# Altium schematic symbol library BARKO_SCHLIB.SchLib: 1064 symbols (part 7 of 11) (continued)
## IC-TIOL111DMWR (continued)
IC TRANSCEIVER 1/1 10VSON; Manufacturer: Texas Instruments; Manufacturer Part Number: TIOL111DMWR; Receiver Hysteresis: 750mV; Data Rate: 250Kbps; Supplier 1: Digi-Key; Supplier Part Number 1: 296-49943-1-ND; Stock: 596; Pricing: 1=3.47, 10=3.12, 25=2.9496, 100=2.4254, 250=2.1763, 500=2.0976 (USD); RoHS: No; Mount: Surface Mount; Min Operating Temperature: -40°C; Max Operating Temperature: 125°C; Packaging: Cut Tape; ComponentLink1URL: http://www.ti.com/lit/ds/symlink/tiol111.pdf?src-supplier=Digi-Key; ComponentLink1Description: http://www.ti.com/lit/ds/symlink/tiol111.pdf?src-supplier=Digi-Key
footprint 10-VSON EP (SON, 10-Leads, Body 3x3mm, Pitch 0.5mm, Thermal Pad 2.4x1.65mm, TI Recommended)
pins: 1 VCC_IN/OUT , 2 NFAULT, 3 RX, 4 TX, 5 EN, 6 ILIM, 7 L-, 8 CQ, 9 L+, 10 WAKE, 11 GND

## IC-TJA1051T,118
designator U?, comment TJA1051T,118
IC CAN TXRX HI-SPEED 8-SOIC; Manufacturer: NXP Semiconductors; Data Rate: 1Mbps; Min Supply Voltage: 4.5V; Max Supply Voltage: 5.5V; Number of Transceivers: 1; Nominal Supply Current: 70mA; Operating Supply Voltage: 5V; Washability: OK; .Creator: M.OZKAN; .PCBCHK: USED; Supplier 1: Digi-Key; Manufacturer Part Number: TJA1051T,118; Stock 1: 59856; Pricing 1: 1=1.12000, 10=1.00000, 100=0.77990, 500=0.64426, 1000=0.50862 (USD); RoHS: Yes; Mount: Surface Mount; Case/Package: SO; Number of Pins: 8; Min Operating Temperature: -40°C; Max Operating Temperature: 125°C; Package Quantity: 1; Packaging: Tape and Reel; Max Supply Current: 70mA; Interface: CAN; Radiation Hardening: No; Lead Free: Lead Free; ComponentLink1URL: https://datasheet.ciiva.com/1767/tja1051-1767286.pdf?src-supplier=Digi-Key; ComponentLink1Description: https://datasheet.ciiva.com/1767/tja1051-1767286.pdf?src-supplier=Digi-Key; ComponentLink2URL: https://datasheet.ciiva.com/16199/tja1051-16199462.pdf?src-supplier=Future+Electronics; ComponentLink2Description: https://datasheet.ciiva.com/16199/tja1051-16199462.pdf?src-supplier=Future+Electronics; ComponentLink3URL: https://datasheet.ciiva.com/1767/tja1051-1767287.pdf?src-supplier=Digi-Key; ComponentLink3Description: https://datasheet.ciiva.com/1767/tja1051-1767287.pdf?src-supplier=Digi-Key; ComponentLink4URL: https://datasheet.ciiva.com/11212/tja1051-11212759.pdf?src-supplier=Avnet; ComponentLink4Description: https://datasheet.ciiva.com/11212/tja1051-11212759.pdf?src-supplier=Avnet; ComponentLink5URL: https://datasheet.ciiva.com/1767/tja1051-1767288.pdf?src-supplier=Digi-Key; ComponentLink5Description: https://datasheet.ciiva.com/1767/tja1051-1767288.pdf?src-supplier=Digi-Key; ComponentLink6URL: https://datasheet.ciiva.com/15149/getdatasheetpartid-248780-15149981.pdf?src-supplier=Verical; ComponentLink6Description: https://datasheet.ciiva.com/15149/getdatasheetpartid-248780-15149981.pdf?src-supplier=Verical; Supplier Part Number 1: 568-8683-1-ND; .SCHCHK: USED
footprint SOIC8
pins: 1 TX (in), 2 GND (power), 3 VCC (power), 4 RX (out), 5 NC (in), 6 CANL (io), 7 CANH (io), 8 S (in)

## IC-TJA1051T/3/1J
designator U?, comment TJA1051T/3
IC CAN TRANSEIVER HS 8SOIC; Manufacturer: NXP Semiconductors; Manufacturer Part Number: TJA1051T/3/1J; Data Rate: 5Mbps; Min Supply Voltage: 4.5V; Max Supply Voltage: 5.5V; Number of Transceivers: 1; Simplex/Duplex: Half Duplex; Receiver Hysteresis: 120mV; Max Supply Current: 70mA; Washability: OK; .Creator: M.OZKAN; .PCBCHK: USED; Supplier 1: Digi-Key; Stock 1: 2965; Pricing 1: 1=1.07000, 10=0.95300, 100=0.74270, 500=0.61352, 1000=0.48437 (USD); RoHS: Yes; Mount: Surface Mount; Case/Package: SOIC; Number of Pins: 8; Contact Plating: Gold,Silver; Min Operating Temperature: -40°C; Max Operating Temperature: 150°C; Packaging: Tape and Reel; REACH SVHC: No SVHC; Lead Free: Lead Free; ComponentLink1URL: http://www.farnell.com/datasheets/1931504.pdf?src-supplier=Farnell; ComponentLink1Description: http://www.farnell.com/datasheets/1931504.pdf?src-supplier=Farnell; ComponentLink2URL: http://www.nxp.com/documents/data_sheet/TJA1051.pdf?src-supplier=Avnet; ComponentLink2Description: http://www.nxp.com/documents/data_sheet/TJA1051.pdf?src-supplier=Avnet; ComponentLink3URL: http://www.nxp.com/documents/data_sheet/TJA1051.pdf?src-supplier=Avnet+Asia; ComponentLink3Description: http://www.nxp.com/documents/data_sheet/TJA1051.pdf?src-supplier=Avnet+Asia; ComponentLink4URL: https://www.nxp.com/docs/en/data-sheet/TJA1051.pdf?src-supplier=Digi-Key; ComponentLink4Description: https://www.nxp.com/docs/en/data-sheet/TJA1051.pdf?src-supplier=Digi-Key; ComponentLink5URL: http://www.farnell.com/datasheets/1931504.pdf?src-supplier=Element14; ComponentLink5Description: http://www.farnell.com/datasheets/1931504.pdf?src-supplier=Element14; Supplier Part Number 1: 568-13277-1-ND; .SCHCHK: USED
footprint SOIC8
pins: 1 TX (in), 2 GND (power), 3 VCC (power), 4 RX (out), 5 VIO (in), 6 CANL (io), 7 CANH (io), 8 S (in)

## IC-TJA1051T/E,118
designator U?, comment TJA1051T/E,118
IC TRANSCEIVER HALF 1/1 8SO; Manufacturer: NXP Semiconductors; Data Rate: 1Mbps; Max Supply Voltage: 5.5V; Operating Supply Voltage: 5V; Min Supply Voltage: 4.5V; Nominal Supply Current: 70mA; Number of Transceivers: 1; Washability: OK; .Creator: M.OZKAN; .PCBCHK: USED; ComponentLink1URL: https://datasheet.ciiva.com/16639/tja1051-16639386.pdf?src-supplier=Avnet+Europe; ComponentLink1Description: https://datasheet.ciiva.com/16639/tja1051-16639386.pdf?src-supplier=Avnet+Europe; ComponentLink2URL: https://datasheet.ciiva.com/11212/tja1051-11212764.pdf?src-supplier=Avnet; ComponentLink2Description: https://datasheet.ciiva.com/11212/tja1051-11212764.pdf?src-supplier=Avnet; ComponentLink3URL: https://datasheet.ciiva.com/1767/tja1051-1767286.pdf?src-supplier=Digi-Key; ComponentLink3Description: https://datasheet.ciiva.com/1767/tja1051-1767286.pdf?src-supplier=Digi-Key; ComponentLink4URL: https://datasheet.ciiva.com/16199/tja1051-16199462.pdf?src-supplier=Future+Electronics; ComponentLink4Description: https://datasheet.ciiva.com/16199/tja1051-16199462.pdf?src-supplier=Future+Electronics; ComponentLink5URL: https://datasheet.ciiva.com/1767/tja1051-1767287.pdf?src-supplier=Digi-Key; ComponentLink5Description: https://datasheet.ciiva.com/1767/tja1051-1767287.pdf?src-supplier=Digi-Key; ComponentLink6URL: https://datasheet.ciiva.com/11212/tja1051-11212759.pdf?src-supplier=Avnet; ComponentLink6Description: https://datasheet.ciiva.com/11212/tja1051-11212759.pdf?src-supplier=Avnet; ComponentLink7URL: https://datasheet.ciiva.com/1767/tja1051-1767288.pdf?src-supplier=Digi-Key; ComponentLink7Description: https://datasheet.ciiva.com/1767/tja1051-1767288.pdf?src-supplier=Digi-Key; ComponentLink8URL: https://datasheet.ciiva.com/15149/getdatasheetpartid-248780-15149981.pdf?src-supplier=Verical; ComponentLink8Description: https://datasheet.ciiva.com/15149/getdatasheetpartid-248780-15149981.pdf?src-supplier=Verical; Supplier 1: Digi-Key; Manufacturer Part Number: TJA1051T/E,118; Stock 1: 48191; Pricing 1: 1=1.07000, 10=0.95300, 100=0.74270, 500=0.61352, 1000=0.48437 (USD); RoHS: Yes; Mount: Surface Mount; Case/Package: SO; Number of Pins: 8; Min Operating Temperature: -40°C; Max Operating Temperature: 150°C; Packaging: Tape and Reel; Package Quantity: 2500; Radiation Hardening: No; Lead Free: Lead Free; Supplier Part Number 1: 568-8685-1-ND; .SCHCHK: USED
footprint SOIC8
pins: 1 TX (in), 2 GND (power), 3 VCC (power), 4 RX (out), 5 EN (in), 6 CANL (io), 7 CANH (io), 8 S (in)

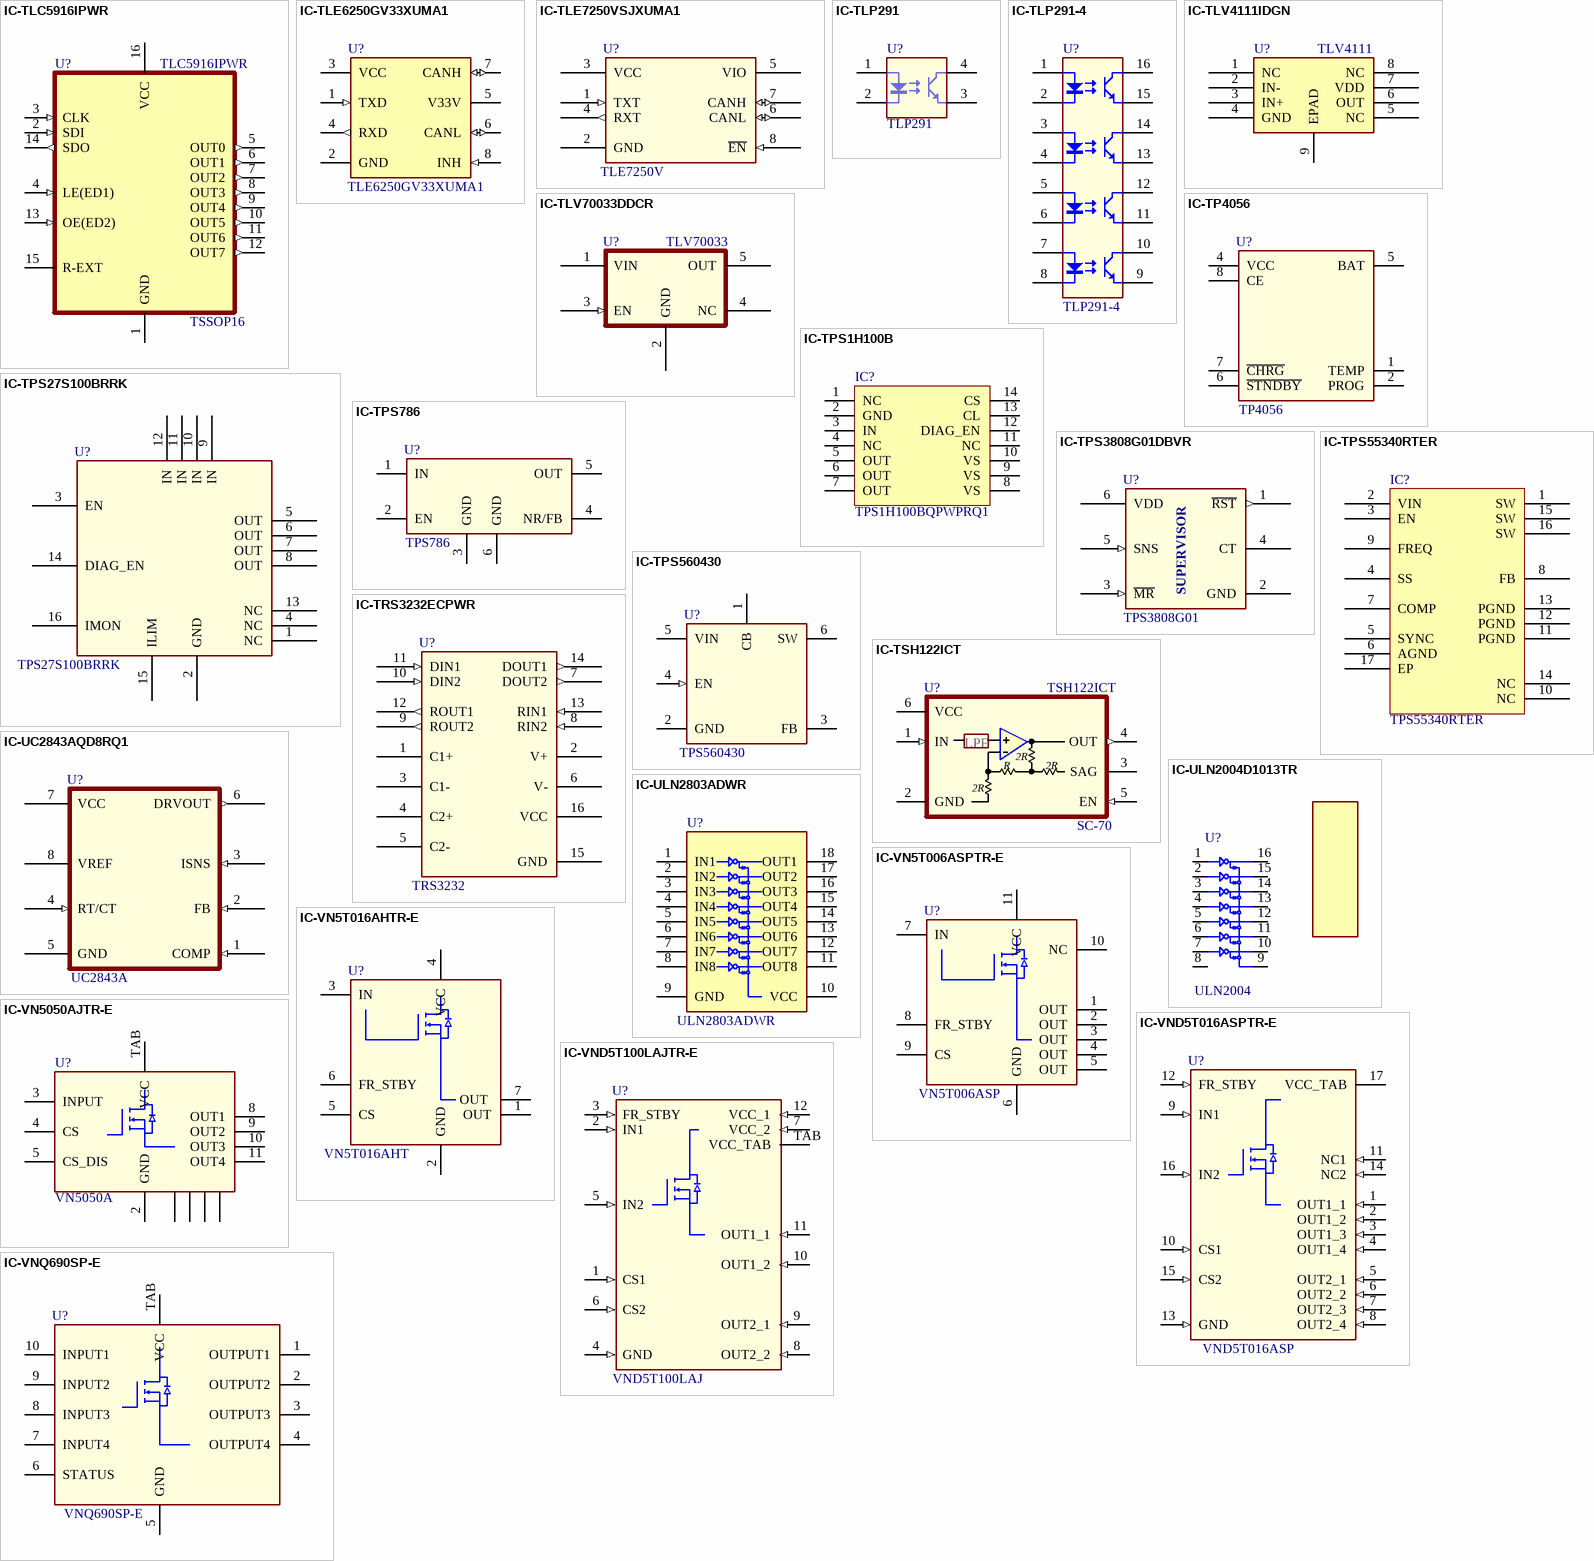
[diagram p30: symbols IC-TLC5916IPWR to IC-VNQ690SP-E]

## IC-TLC5916IPWR
designator U?, comment TLC5916IPWR  Case/Package: TSSOP16
IC LED DRIVER LINEAR 16-TSSOP; Manufacturer: Texas Instruments; Max Power Dissipation: 900mW; Number of Outputs: 8; Frequency: 30MHz; Max Supply Voltage: 5.5V; Min Supply Voltage: 3V; Nominal Supply Current: 22mA; Output Current: 120mA; Output Voltage: 17V; Low Level Output Current: 1mA; High Level Output Current: -1mA; Topology: Boost; .Creator: F:TALI; .PCBCHK: USED; Washability: OK; Supplier 1: Digi-Key; Manufacturer Part Number: TLC5916IPWR; Stock 1: 35679; Pricing 1: 1=1.41, 10=1.258, 100=0.9808, 500=0.8102, 1000=0.63963 (USD); Number of Pins: 16; Weight: 0.002183oz; Contact Plating: Gold; Min Operating Temperature: -40°C; Max Operating Temperature: 125°C; Package Quantity: 1; Packaging: Tape and Reel; Max Output Current: 120mA; Max Input Voltage: 5.5V; Min Input Voltage: 3V; Max Supply Current: 22mA; Power Dissipation: 900mW; Number of Segments: 8; Switching Frequency: 30MHz; Radiation Hardening: No; Lead Free: Lead Free; REACH SVHC: No SVHC; ComponentLink1URL: http://www.farnell.com/datasheets/1887543.pdf; ComponentLink1Description: http://www.farnell.com/datasheets/1887543.pdf; ComponentLink2URL: http://www.ti.com/lit/ds/symlink/tlc5917.pdf; ComponentLink2Description: http://www.ti.com/lit/ds/symlink/tlc5917.pdf; ComponentLink3URL: https://www.verical.com/server-webapp/html/getDatasheet?partID=297377; ComponentLink3Description: https://www.verical.com/server-webapp/html/getDatasheet?partID=297377; ComponentLink4URL: http://datasheet.iiic.cc/texas_instruments/TLC5916IPWR.pdf; ComponentLink4Description: http://datasheet.iiic.cc/texas_instruments/TLC5916IPWR.pdf; Supplier Part Number 1: 296-22711-6-ND; .SCHCHK: USED
footprint TSSOP16
pins: 1 GND (power), 2 SDI (in), 3 CLK (in), 4 LE(ED1) (in), 5 OUT0 (out), 6 OUT1 (out), 7 OUT2 (out), 8 OUT3 (out), 9 OUT4 (out), 10 OUT5 (out), 11 OUT6 (out), 12 OUT7 (out), 13 OE(ED2) (in), 14 SDO (out), 15 R-EXT, 16 VCC (power)

## IC-TLE6250GV33XUMA1
designator U?, comment TLE6250GV33XUMA1
CAN 1MBd Standby 5V Automotive 8-Pin DSO T/R; Manufacturer: Infineon; Min Supply Voltage: 4.5V; Max Supply Voltage: 5.5V; Number of Transceivers: 1; Nominal Supply Current: 70mA; Quiescent Current: 10A; Washability: OK; .Creator: M.OZKAN; .PCBCHK: USED; Supplier 1: Digi-Key; Manufacturer Part Number: TLE6250GV33XUMA1; Stock 1: 11250; Pricing 1: 1=1.63000, 10=1.45700, 100=1.13620, 500=0.93860, 1000=0.74100 (USD); RoHS: Yes; Mount: Surface Mount; Case/Package: SOIC; Number of Pins: 8; Min Operating Temperature: -40°C; Max Operating Temperature: 150°C; Operating Supply Voltage: 5V; Packaging: Tape and Reel; Lead Free: Lead Free; Halogen Free: Halogen Free; ComponentLink1URL: https://datasheet.ciiva.com/25624/0900766b81074499-25624341.pdf?src-supplier=RSComponents; ComponentLink1Description: https://datasheet.ciiva.com/25624/0900766b81074499-25624341.pdf?src-supplier=RSComponents; Supplier Part Number 1: TLE6250GV33XUMA1CT-ND; .SCHCHK: USED
footprint INF-PG-DSO-8-16_M (SOP, 8-Leads, Body 4.9x3.9mm, Pitch 1.27mm, IPC Low Density)
pins: 1 TXD (in) "CAN transmit data input; 20 k ohm pull-up, LOW in dominant state", 2 GND (power) "Ground", 3 VCC (power) "5 V Supply input", 4 RXD (out) "CAN receive data output; LOW in dominant state, integrated pull-up", 5 V33V (power) "Logic supply input;3.3 V OR 5 V microcontroller logic supply can be connected here! The digital I/Os of the TLE6250GV33 adopt to the connected microcontroller logic supply at V33V", 6 CANL (io) "Low line I/O; LOW in dominant state", 7 CANH (io) "High line I/O; HIGH in dominant state", 8 INH (in) "Inhibit Input; control input, 20 k ohm pull, set LOW for normal mode"

## IC-TLE7250VSJXUMA1
designator U?, comment TLE7250V
IC TXRX CAN PG-DSO-8; Manufacturer: Infineon; Manufacturer Part Number: TLE7250VSJXUMA1; Data Rate: 2Mbps; Min Supply Voltage: 4.5V; Number of Transceivers: 1; Max Supply Voltage: 5.5V; Quiescent Current: 13A; Operating Supply Voltage: 3.3V; Washability: OK; .Creator: M.OZKAN; .PCBCHK: USED; Supplier 1: Digi-Key; Stock 1: 4195; Pricing 1: 1=1,06000, 10=0,94700, 100=0,73840, 500=0,61000, 1000=0,48158 (USD); RoHS: Yes; Number of Pins: 8; Lead Free: Lead Free; Halogen Free: Halogen Free; ComponentLink1URL: http://www.farnell.com/datasheets/2354884.pdf?src-supplier=Farnell; ComponentLink1Description: http://www.farnell.com/datasheets/2354884.pdf?src-supplier=Farnell; ComponentLink2URL: http://www.mouser.com/ds/2/196/Infineon-TLE7250V-DS-v01_00-EN-793317.pdf?src-supplier=Mouser; ComponentLink2Description: http://www.mouser.com/ds/2/196/Infineon-TLE7250V-DS-v01_00-EN-793317.pdf?src-supplier=Mouser; ComponentLink3URL: https://www.infineon.com/dgdl/Infineon-TLE7250V-DS-v01_00-EN.pdf?fileId=5546d46259d9a4bf015a3cf6417e5e59&src-supplier=Digi-Key; ComponentLink3Description: https://www.infineon.com/dgdl/Infineon-TLE7250V-DS-v01_00-EN.pdf?fileId=5546d46259d9a4bf015a3cf6417e5e59&src-supplier=Digi-Key; ComponentLink4URL: http://www.infineon.com/dgdl/Infineon-TLE7250V-DS-v01_00-EN.pdf?fileId=5546d4624fb7fef2014fe04af1fa5f63&ack=t&src-supplier=Avnet; ComponentLink4Description: http://www.infineon.com/dgdl/Infineon-TLE7250V-DS-v01_00-EN.pdf?fileId=5546d4624fb7fef2014fe04af1fa5f63&ack=t&src-supplier=Avnet; Supplier Part Number 1: TLE7250VSJXUMA1CT-ND; .SCHCHK: USED
footprint INF-PG-DSO-8-16_M (SOP, 8-Leads, Body 4.9x3.9mm, Pitch 1.27mm, IPC Low Density)
pins: 1 TXT (in), 2 GND (power), 3 VCC (power), 4 RXT (out), 5 VIO (power), 6 CANL (io), 7 CANH (io), 8 ~{EN} (in)

## IC-TLP291
designator U?, comment TLP291
OPTOISOLATOR 3.75KV TRANS 4-SO; Manufacturer: Toshiba; Manufacturer Part Number: TLP291(GB-TP,SE; Collector Emitter Voltage (VCEO): 300mV; Forward Voltage: 1.25V; Number of Channels: 1; Forward Current: 50mA; Max Output Voltage: 80V; Number of Elements: 4; Reverse Breakdown Voltage: 5V; Power Dissipation: 170mW; Collector Emitter Saturation Voltage: 400mV; Current Transfer Ratio: 400%; .Creator: F:TALI; .PCBCHK: USED; Washability: OK; Supplier 1: Digi-Key; RoHS: Yes; Stock 1: 39163; Pricing 1: 1 = 0,51000, 10 = 0,36300, 25 = 0,31480, 100 = 0,24200, 250 = 0,19664, 500 = 0,14520, 1000 = 0,12100 (USD); Mount: Surface Mount; Case/Package: SO; Number of Pins: 4; Min Operating Temperature: -55°C; Max Operating Temperature: 110°C; Packaging: Tape and Reel; Output Current per Channel: 50mA; Package Quantity: 2500; ComponentLink1URL: https://toshiba.semicon-storage.com/info/docget.jsp?did=14152&prodName=TLP291(SE&src-supplier=Digi-Key; ComponentLink1Description: https://toshiba.semicon-storage.com/info/docget.jsp?did=14152&prodName=TLP291(SE&src-supplier=Digi-Key; ComponentLink2URL: http://www.mouser.com/ds/2/408/TLP291_datasheet_en_20140922-737000.pdf?src-supplier=Mouser; ComponentLink2Description: http://www.mouser.com/ds/2/408/TLP291_datasheet_en_20140922-737000.pdf?src-supplier=Mouser; Supplier Part Number 1: TLP291(GB-TPSECT-ND; .SCHCHK: USED
pins: 1, 2, 3, 4

## IC-TLP291-4
designator U?, comment TLP291-4
OPTOISOLTR 2.5KV 4CH TRANS 16-SO; Manufacturer: Toshiba; Manufacturer Part Number: TLP291-4(GB-TP,E); .Creator: F:TALI; .PCBCHK: USED; Current Transfer Ratio: 400%; Collector Emitter Saturation Voltage: 400mV; Number of Elements: 4; Power Dissipation: 170mW; Collector Emitter Voltage (VCEO): 80V; Forward Current: 50mA; Reverse Breakdown Voltage: 5V; Forward Voltage: 1.2V; Max Input Voltage: 1.4V; ComponentLink1URL: http://www.mouser.com/ds/2/408/TLP291-4-204553.pdf?src-supplier=Mouser; ComponentLink1Description: http://www.mouser.com/ds/2/408/TLP291-4-204553.pdf?src-supplier=Mouser; .SCHCHK: USED; Supplier 1: Digi-Key; Supplier Part Number 1: TLP291-4(GB-TPE)CT-ND; Stock: 8055; Pricing: 1=1.03, 10=0.832, 100=0.5122, 500=0.442, 1000=0.364 (USD); RoHS: Yes; Mount: Surface Mount; Case/Package: SO; Number of Pins: 16; Min Operating Temperature: -55°C; Max Operating Temperature: 110°C; Packaging: Tape and Reel; Max Output Voltage: 80V; Output Current per Channel: 50mA; Max Collector Current: 50mA; Max Input Current: 50mA; Package Quantity: 1; Number of Channels: 4; Max Power Dissipation: 170mW; Max Output Current: 50mA; Radiation Hardening: No; ComponentLink2URL: https://datasheet.ciiva.com/2090/half-pitch4-chtransphotocouplersref-2090435.pdf?src-supplier=Digi-Key; ComponentLink2Description: https://datasheet.ciiva.com/2090/half-pitch4-chtransphotocouplersref-2090435.pdf?src-supplier=Digi-Key; ComponentLink3URL: https://datasheet.ciiva.com/45423/half-pitch4-chtransphotocouplersref-45423196.pdf?src-supplier=Digi-Key; ComponentLink3Description: https://datasheet.ciiva.com/45423/half-pitch4-chtransphotocouplersref-45423196.pdf?src-supplier=Digi-Key; ComponentLink4URL: https://datasheet.ciiva.com/45423/half-pitch4-chtransphotocouplersref-45423197.pdf?src-supplier=Digi-Key; ComponentLink4Description: https://datasheet.ciiva.com/45423/half-pitch4-chtransphotocouplersref-45423197.pdf?src-supplier=Digi-Key; ComponentLink5URL: https://datasheet.ciiva.com/45423/half-pitch4-chtransphotocouplersref-45423198.pdf?src-supplier=Digi-Key; ComponentLink5Description: https://datasheet.ciiva.com/45423/half-pitch4-chtransphotocouplersref-45423198.pdf?src-supplier=Digi-Key
footprint SOIC16
pins: 1, 2, 3, 4, 5, 6, 7, 8, 9, 10, 11, 12, 13, 14, 15, 16

## IC-TLV4111IDGN
designator U?, comment TLV4111
OP Amp Single GP R-R O/P 6V 8-Pin HVSSOP EP Tube; Manufacturer: Texas Instruments; Manufacturer Part Number: TLV4111IDGN; Min Supply Voltage: 2.5V; Voltage Gain: 110dB; Output Current: 320mA; Nominal Supply Current: 1mA; Unity Gain Bandwidth Product: 2.7MHz; Common Mode Rejection Ratio: 63dB; Number of Channels: 1; Slew Rate: 1.57V/µs; Max I/O Voltage: 3.5mV; Input Bias Current: 50pA; Operating Supply Current: 700uA; Power Dissipation: 2.37W; Power Supply Rejection Ratio (PSRR): 70dB; .Creator: F:TALI; .PCBCHK: USED; Washability: OK; Supplier 1: Digi-Key; Stock 1: 420; Pricing 1: 1 = 2.80000, 10 = 2.51600, 80 = 2.37825, 160 = 2.06113, 560 = 1.75463, 1040 = 1.47980, 2560 = 1.40581, 5040 = 1.35296 (USD); RoHS: Yes; Case/Package: HTSSOP EP; Number of Pins: 8; Min Operating Temperature: -40°C; Max Operating Temperature: 125°C; Packaging: Rail/Tube; Max Supply Voltage: 6V; Package Quantity: 80; Input Offset Voltage (Vos): 3.5mV; Gain Bandwidth Product: 2.7MHz; Number of Circuits: 1; Output Current per Channel: 320mA; Number of Elements: 1; Bandwidth: 2.7MHz; Length: 3mm; Height: 1.02mm; Width: 3mm; Radiation Hardening: No; Lead Free: Lead Free; ComponentLink1URL: https://datasheet.ciiva.com/30505/tlv4111idgn-30505382.pdf?src-supplier=RSComponents; ComponentLink1Description: https://datasheet.ciiva.com/30505/tlv4111idgn-30505382.pdf?src-supplier=RSComponents; ComponentLink2URL: https://datasheet.ciiva.com/14461/slos289e-14461687.pdf?src-supplier=Avnet; ComponentLink2Description: https://datasheet.ciiva.com/14461/slos289e-14461687.pdf?src-supplier=Avnet; ComponentLink3URL: https://datasheet.ciiva.com/26266/slos289e-26266040.pdf?src-supplier=Avnet+Europe; ComponentLink3Description: https://datasheet.ciiva.com/26266/slos289e-26266040.pdf?src-supplier=Avnet+Europe; ComponentLink4URL: https://datasheet.ciiva.com/6630/tlv4110-6630523.pdf?src-supplier=Digi-Key; ComponentLink4Description: https://datasheet.ciiva.com/6630/tlv4110-6630523.pdf?src-supplier=Digi-Key; ComponentLink5URL: https://datasheet.ciiva.com/48707/001072128-da-01-en-ic-opamp-gp-r-r-2-tlv4111idgn-msop-8-tid-48707829.pdf?src-supplier=Conrad; ComponentLink5Description: https://datasheet.ciiva.com/48707/001072128-da-01-en-ic-opamp-gp-r-r-2-tlv4111idgn-msop-8-tid-48707829.pdf?src-supplier=Conrad; Supplier Part Number 1: 296-34490-5-ND; .SCHCHK: USED
footprint DGN-8
pins: 1 NC, 2 IN-, 3 IN+, 4 GND, 5 NC, 6 OUT, 7 VDD, 8 NC, 9 EPAD

## IC-TLV70033DDCR
designator U?, comment TLV70033
IC REG LINEAR 3.3V 200MA SOT23-5; Manufacturer: Texas Instruments; Manufacturer Part Number: TLV70033DDCR; Number of Outputs: 1; Max Power Dissipation: 500mW; Dropout Voltage: 175mV; Max Input Voltage: 5.5V; Min Input Voltage: 2V; Min Current Limit: 220mA; Polarity: Positive; Accuracy: 2%; Quiescent Current: 30uA; Output Type: Fixed; .Creator: F:TALI; .PCBCHK: USED; Washability: OK; Supplier 1: Digi-Key; Supplier Part Number 1: 296-27937-6-ND; Stock 1: 618439; Pricing 1: 1=0.48, 10=0.409, 100=0.3057, 500=0.2402, 1000=0.18561 (USD); Case/Package: TSOT; Number of Pins: 5; Min Operating Temperature: -40°C; Max Operating Temperature: 125°C; Output Voltage: 3.3V; Output Current: 200mA; Package Quantity: 1; Packaging: Tape and Reel; Max Output Current: 200mA; Number of Regulators: 1; Power Dissipation: 500mW; Nominal Output Voltage: 3.3V; Min Output Voltage: 3.3V; Output Voltage Accuracy: 2%; Max Output Voltage: 3.3V; Radiation Hardening: No; REACH SVHC: No SVHC; Lead Free: Lead Free; ComponentLink1URL: http://www.farnell.com/datasheets/1825698.pdf?src-supplier=Element14; ComponentLink1Description: http://www.farnell.com/datasheets/1825698.pdf?src-supplier=Element14; .SCHCHK: USED
footprint SOT23-5
pins: 1 VIN (power), 2 GND (power), 3 EN (in), 4 NC (power), 5 OUT (power)

## IC-TP4056
designator U?, comment TP4056
REG/STANDALONE LINEAR 1A SOP8; Manufacturer Part Number: TP4056-42-ESOP8; Manufacturer: TOPPOWER; Alternate Part Number: DIO5158XS8; Washability: OK; .Creator: M.OZKAN; .PCBCHK: USED; .SCHCHK: USED
footprint SOIC8-D0008A_M (SOIC, 8-Leads, Body 5x4mm, Pitch 1.27mm, IPC Low Density)
pins: 1 TEMP, 2 PROG, 4 VCC, 5 BAT, 6 ~{STNDBY}, 7 ~{CHRG}, 8 CE

## IC-TPS1H100B
designator IC?, comment TPS1H100BQPWPRQ1
IC PWR SWTCH N-CHAN 1:1 14HTSSOP; Manufacturer: Texas Instruments; Number of Outputs: 1; Interface: On/Off; Max Output Current: 4A; Fault Protection: Over Temperature; Output Configuration: High Side; Supplier 1: Mouser; Manufacturer Part Number: TPS1H100BQPWPRQ1; Stock 1: 12601; Pricing 1: 1=1.86000, 10=1.57000, 100=1.26000, 250=1.10000, 500=1.07000, 1000=0.84800 (USD); RoHS: Yes; Min Operating Temperature: -40°C; Max Operating Temperature: 125°C; Packaging: Cut Tape; Number of Channels: 1; Lead Free: Lead Free; ComponentLink1URL: http://www.ti.com/lit/ds/symlink/tps1h100-q1.pdf?src-supplier=Digi-Key; ComponentLink1Description: http://www.ti.com/lit/ds/symlink/tps1h100-q1.pdf?src-supplier=Digi-Key; ComponentLink2URL: http://www.ti.com/lit/gpn/tps1h100-q1?src-supplier=Mouser; ComponentLink2Description: http://www.ti.com/lit/gpn/tps1h100-q1?src-supplier=Mouser; Supplier Part Number 1: 595-TPS1H100BQPWPRQ1
footprint 14-HTSSOP (TSOP, 14-Leads, Body 5.00x4.40mm, Pitch 0.65mm, Thermal Pad 3.00x2.46mm, IPC Medium Density)
pins: 1 NC, 2 GND, 3 IN, 4 NC, 5 OUT, 6 OUT, 7 OUT, 8 VS, 9 VS, 10 VS, 11 NC, 12 DIAG_EN, 13 CL, 14 CS

## IC-TPS27S100BRRK
designator U?, comment TPS27S100BRRK
IC POWER MANAGEMENT; Manufacturer 1: Texas Instruments; Manufacturer Part Number: TPS27S100BRRKR; Number of Channels: 1; Interface: Logic; Fault Protection: Over Temperature; Output Configuration: High Side; Max Output Current: 13A; Stock 1: 2862; Pricing 1: 1=2,31000, 10=2,07200, 25=1,95520, 100=1,56400, 250=1,36852, 500=1,32940, 1000=1,05570 (USD); Min Operating Temperature: -40°C; Max Operating Temperature: 125°C; Packaging: Tape and Reel; Number of Outputs: 1; ComponentLink1URL: http://www.ti.com/lit/ds/symlink/tps27s100.pdf?src-supplier=Digi-Key; ComponentLink1Description: http://www.ti.com/lit/ds/symlink/tps27s100.pdf?src-supplier=Digi-Key; ComponentLink2URL: https://octopart.com/click/track?ai=10049&ct=datasheets&sig=01e2b6f&at=physicalpart&sid=370&ppid=87456673&hlid=30204204&src-supplier=TI+store; ComponentLink2Description: https://octopart.com/click/track?ai=10049&ct=datasheets&sig=01e2b6f&at=physicalpart&sid=370&ppid=87456673&hlid=30204204&src-supplier=TI+store; ComponentLink3URL: http://sigma.octopart.com/49250594/technical_drawing/Texas-Instruments-TPS27S100BPWPT.pdf?src-supplier=TI+store; ComponentLink3Description: http://sigma.octopart.com/49250594/technical_drawing/Texas-Instruments-TPS27S100BPWPT.pdf?src-supplier=TI+store; Supplier 1: Digi-Key; Manufacturer: Texas Instruments; RoHS: No; Supplier Part Number 1: 296-TPS27S100BRRKRCT-ND
footprint QFN-16 (QFN, 16-Leads, Body 4,00x3,50mm, Pitch 0,50mm/1,50mm, Thermal Pad 2,05x2,55mm, IPC Medium Density)
pins: 1 NC, 2 GND, 3 EN, 4 NC, 5 OUT, 6 OUT, 7 OUT, 8 OUT, 9 IN, 10 IN, 11 IN, 12 IN, 13 NC, 14 DIAG_EN, 15 ILIM, 16 IMON

## IC-TPS786
designator U?, comment TPS786
IC REG LIN POS ADJ 1.5A DDPAK; Manufacturer: Texas Instruments; Manufacturer Part Number: TPS78601KTTR; Dropout Voltage: 310mV; Output Voltage: 5.5V; Number of Outputs: 1; Min Input Voltage: 2.7V; Input Bias Current: 310uA; Polarity: Positive; Min Output Voltage: 1.22V; Quiescent Current: 200uA; Output Type: Adjustable; Min Current Limit: 2.4A; Reference Voltage: 1.225V; Output Voltage Accuracy: 3%; Supplier 1: Digi-Key; Stock 1: 279; Pricing 1: 1=4,08000, 10=3,66500, 25=3,46520, 100=2,84900, 250=2,55640 (USD); RoHS: Yes; Case/Package: TO-263; Number of Pins: 3; Contact Plating: Tin; Min Operating Temperature: -40°C; Max Operating Temperature: 125°C; Output Current: 1.5A; Packaging: Tape and Reel; Package Quantity: 1; Max Output Current: 1.5A; Max Input Voltage: 5.5V; Number of Regulators: 1; Max Output Voltage: 5.5V; Accuracy: 3%; Lead Free: Lead Free; REACH SVHC: No SVHC; ComponentLink1URL: https://datasheet.ciiva.com/27056/2003900-27056024.pdf?src-supplier=Jameco; ComponentLink1Description: https://datasheet.ciiva.com/27056/2003900-27056024.pdf?src-supplier=Jameco; ComponentLink2URL: https://datasheet.ciiva.com/2064/tps78601-2064978.pdf?src-supplier=Digi-Key; ComponentLink2Description: https://datasheet.ciiva.com/2064/tps78601-2064978.pdf?src-supplier=Digi-Key; ComponentLink3URL: https://datasheet.ciiva.com/2064/tps78601-2064979.pdf?src-supplier=Digi-Key; ComponentLink3Description: https://datasheet.ciiva.com/2064/tps78601-2064979.pdf?src-supplier=Digi-Key; ComponentLink4URL: https://datasheet.ciiva.com/2064/tps78601-2064980.pdf?src-supplier=Digi-Key; ComponentLink4Description: https://datasheet.ciiva.com/2064/tps78601-2064980.pdf?src-supplier=Digi-Key; ComponentLink5URL: https://datasheet.ciiva.com/41462/001015114-da-01-en-ic-reg-ldo-adj-tps78601kttr-to-263-5-tid-41462965.pdf?src-supplier=Conrad; ComponentLink5Description: https://datasheet.ciiva.com/41462/001015114-da-01-en-ic-reg-ldo-adj-tps78601kttr-to-263-5-tid-41462965.pdf?src-supplier=Conrad; Supplier Part Number 1: 296-27089-1-ND
footprint DDPAK-5_Q
pins: 1 IN, 2 EN, 3 GND, 4 NR/FB, 5 OUT, 6 GND

## IC-TPS3808G01DBVR
designator U?, comment TPS3808G01
IC VOLT SUPERVISOR ADJ SOT23-6; Manufacturer 1: Texas Instruments; Manufacturer Part Number 1: TPS3808G01DBVR; Max Supply Voltage: 6.5V; Min Supply Voltage: 1.65V; Watchdog Timer: No; Nominal Supply Current: 2.7uA; Number of Voltages Monitored: 1; Reset: Active Low; Operating Supply Current: 2.4uA; Threshold Voltage: 405mV; Washability: OK; .Creator: M.OZKAN; .PCBCHK: USED; Supplier 1: Digi-Key; Stock 1: 17787; Pricing 1: 1=1,82000, 10=1,63200, 25=1,54000, 100=1,23190, 250=1,07788, 500=1,04710, 1000=0,83152 (USD); RoHS: Yes; Case/Package: SOT-23; Number of Pins: 6; Min Operating Temperature: -40°C; Max Operating Temperature: 125°C; Packaging: Tape and Reel; Package Quantity: 3000; Number of Elements: 1; Quiescent Current: 2.4uA; Radiation Hardening: No; Lead Free: Lead Free; REACH SVHC: No SVHC; ComponentLink1URL: https://datasheet.ciiva.com/15105/getdatasheetpartid-203815-15105984.pdf?src-supplier=Verical; ComponentLink1Description: https://datasheet.ciiva.com/15105/getdatasheetpartid-203815-15105984.pdf?src-supplier=Verical; ComponentLink2URL: https://datasheet.ciiva.com/23940/1764404-23940257.pdf?src-supplier=Newark; ComponentLink2Description: https://datasheet.ciiva.com/23940/1764404-23940257.pdf?src-supplier=Newark; ComponentLink3URL: https://datasheet.ciiva.com/27052/1523276-27052317.pdf?src-supplier=Jameco; ComponentLink3Description: https://datasheet.ciiva.com/27052/1523276-27052317.pdf?src-supplier=Jameco; ComponentLink4URL: https://datasheet.ciiva.com/1970/tps3808g01-1970903.pdf?src-supplier=Digi-Key; ComponentLink4Description: https://datasheet.ciiva.com/1970/tps3808g01-1970903.pdf?src-supplier=Digi-Key; ComponentLink5URL: https://datasheet.ciiva.com/1970/tps3808g01-1970904.pdf?src-supplier=Digi-Key; ComponentLink5Description: https://datasheet.ciiva.com/1970/tps3808g01-1970904.pdf?src-supplier=Digi-Key; ComponentLink6URL: https://datasheet.ciiva.com/1970/tps3808g01-1970905.pdf?src-supplier=Digi-Key; ComponentLink6Description: https://datasheet.ciiva.com/1970/tps3808g01-1970905.pdf?src-supplier=Digi-Key; ComponentLink7URL: https://datasheet.ciiva.com/7990/1849917-7990457.pdf?src-supplier=Element14; ComponentLink7Description: https://datasheet.ciiva.com/7990/1849917-7990457.pdf?src-supplier=Element14; ComponentLink8URL: https://datasheet.ciiva.com/14207/tps3808g01-14207033.pdf?src-supplier=Avnet; ComponentLink8Description: https://datasheet.ciiva.com/14207/tps3808g01-14207033.pdf?src-supplier=Avnet; ComponentLink9URL: https://datasheet.ciiva.com/14207/tps3808g01-14207034.pdf?src-supplier=Avnet; ComponentLink9Description: https://datasheet.ciiva.com/14207/tps3808g01-14207034.pdf?src-supplier=Avnet; ComponentLink10URL: https://datasheet.ciiva.com/26072/tps3808g01-26072362.pdf?src-supplier=Avnet+Europe; ComponentLink10Description: https://datasheet.ciiva.com/26072/tps3808g01-26072362.pdf?src-supplier=Avnet+Europe; ComponentLink11URL: https://datasheet.ciiva.com/5695/1633687-5695915.pdf?src-supplier=Farnell; ComponentLink11Description: https://datasheet.ciiva.com/5695/1633687-5695915.pdf?src-supplier=Farnell; ComponentLink12URL: https://datasheet.ciiva.com/28475/1882049-28475133.pdf?src-supplier=Element14; ComponentLink12Description: https://datasheet.ciiva.com/28475/1882049-28475133.pdf?src-supplier=Element14; Supplier Part Number 1: 296-17188-1-ND; .SCHCHK: USED
footprint SOT23-6
pins: 1 ~{RST} (out), 2 GND (power), 3 ~{MR} (in), 4 CT, 5 SNS (in), 6 VDD (power)
text: SUPERVISOR

## IC-TPS55340RTER
designator IC?, comment TPS55340RTER
Conv DC-DC Single Step Up 2.9V to 32V 16-Pin WQFN EP T/R; Manufacturer: Texas Instruments; Max Output Current: 5A; Number of Outputs: 1; Output Voltage: 38V; Switching Frequency: 1.14MHz; Synchronous Rectifier: No; Quiescent Current: 500uA; Topology: Boost,Flyback,SEPIC; Output Type: Adjustable; Supplier 1: Mouser; Manufacturer Part Number: TPS55340RTER; Stock 1: 3363; Pricing 1: 1=3,76000, 10=3,38000, 25=3,19000, 100=2,63000, 250=2,36000, 500=2,27000 (USD); RoHS: Yes; Mount: Surface Mount; Number of Pins: 16; Min Operating Temperature: -40°C; Max Operating Temperature: 150°C; Max Input Voltage: 32V; Min Input Voltage: 2.9V; Package Quantity: 1; Packaging: Tape and Reel; Output Current: 5A; Min Output Voltage: 2.9V; Max Output Voltage: 38V; Length: 3.15mm; Height: 0.72mm; Width: 3.15mm; Radiation Hardening: No; REACH SVHC: No SVHC; Lead Free: Lead Free; ComponentLink1URL: https://datasheet.ciiva.com/30477/0900766b8119b0dd-30477490.pdf?src-supplier=RSComponents; ComponentLink1Description: https://datasheet.ciiva.com/30477/0900766b8119b0dd-30477490.pdf?src-supplier=RSComponents; ComponentLink2URL: https://datasheet.ciiva.com/7408/1636652-7408197.pdf?src-supplier=Newark; ComponentLink2Description: https://datasheet.ciiva.com/7408/1636652-7408197.pdf?src-supplier=Newark; ComponentLink3URL: https://datasheet.ciiva.com/14304/tps55340-14304789.pdf?src-supplier=Avnet; ComponentLink3Description: https://datasheet.ciiva.com/14304/tps55340-14304789.pdf?src-supplier=Avnet; ComponentLink4URL: https://datasheet.ciiva.com/7993/1882838-7993896.pdf?src-supplier=Element14; ComponentLink4Description: https://datasheet.ciiva.com/7993/1882838-7993896.pdf?src-supplier=Element14; ComponentLink5URL: https://datasheet.ciiva.com/26104/tps55340-26104346.pdf?src-supplier=Avnet+Europe; ComponentLink5Description: https://datasheet.ciiva.com/26104/tps55340-26104346.pdf?src-supplier=Avnet+Europe; ComponentLink6URL: https://datasheet.ciiva.com/48475/tps55340-48475690.pdf?src-supplier=Avnet; ComponentLink6Description: https://datasheet.ciiva.com/48475/tps55340-48475690.pdf?src-supplier=Avnet; Supplier Part Number 1: 595-TPS55340RTET
footprint S-PWQFN-N16 (PQFN, 16-Leads, Body 3,00x3,00mm, Pitch 0,50mm, Thermal Pad 1,70x1,70mm, IPC Medium Density)
pins: 1 SW, 2 VIN, 3 EN, 4 SS, 5 SYNC, 6 AGND, 7 COMP, 8 FB, 9 FREQ, 10 NC, 11 PGND, 12 PGND, 13 PGND, 14 NC, 15 SW, 16 SW, 17 EP

## IC-TPS560430
designator U?, comment TPS560430
IC REG BUCK PFM 600MA SOT23-6; Manufacturer: Texas Instruments; Manufacturer Part Number: TPS560430XDBVR; .Creator: M.OZKAN; .PCBCHK: USED; Supplier 1: Digi-Key; Supplier Part Number 1: 296-50420-1-ND; Stock: 7604; Pricing: 1=1.19, 10=1.062, 25=1.008, 100=0.774, 250=0.684, 500=0.648, 1000=0.504 (USD); RoHS: No; Min Operating Temperature: -40°C; Max Operating Temperature: 125°C; Features: UVLO; ComponentLink1URL: http://www.ti.com/general/docs/suppproductinfo.tsp?distId=10&amp;gotoUrl=http%3A%2F%2Fwww.ti.com%2Flit%2Fgpn%2Ftps560430&src-supplier=Digi-Key; ComponentLink1Description: http://www.ti.com/general/docs/suppproductinfo.tsp?distId=10&amp;gotoUrl=http%3A%2F%2Fwww.ti.com%2Flit%2Fgpn%2Ftps560430&src-supplier=Digi-Key; ComponentLink2URL: http://www.ti.com/lit/ds/symlink/tps560430.pdf?src-supplier=Digi-Key; ComponentLink2Description: http://www.ti.com/lit/ds/symlink/tps560430.pdf?src-supplier=Digi-Key; .SCHCHK: USED
footprint SOT23-6L
pins: 1 CB, 2 GND (power), 3 FB, 4 EN (in), 5 VIN (power), 6 SW

## IC-TRS3232ECPWR
designator U?, comment TRS3232
IC TRANSCEIVER FULL 2/2 16TSSOP; Manufacturer 1: Texas Instruments; Manufacturer Part Number 1: TRS3232ECPWR; Number of Receivers: 2; Data Rate: 250Kbps; Max Supply Voltage: 5.5V; Min Supply Voltage: 3V; Nominal Supply Current: 1mA; Logic Function: Transceiver,Receiver; Number of Transceivers: 1; Operating Supply Voltage: 5V; Number of I/Os: 8; Propagation Delay: 0.3us; Simplex/Duplex: Full Duplex; .Creator: M.OZKAN; .PCBCHK: USED; Supplier 1: Digi-Key; RoHS: Yes; Category: RS-232 / RS-422 / RS-485 Interface ICs; Stock 1: 4372; Pricing 1: 1=1,16000, 10=1,03300, 25=0,98000, 100=0,75250, 250=0,66500, 500=0,63000, 1000=0,49000 (USD); Mount: Surface Mount; Case/Package: TSSOP; Number of Pins: 16; Weight: 0.002183oz; Min Operating Temperature: -40°C; Max Operating Temperature: 85°C; Packaging: Tape and Reel; Number of Transmitters: 2; Package Quantity: 1; Number of Drivers: 2; Lead Free: Lead Free; REACH SVHC: No SVHC; ComponentLink1URL: https://datasheet.ciiva.com/7295/1764481-7295873.pdf?src-supplier=Newark; ComponentLink1Description: https://datasheet.ciiva.com/7295/1764481-7295873.pdf?src-supplier=Newark; ComponentLink2URL: https://datasheet.ciiva.com/41461/001187063-da-01-en-ic-multich-rs2-trs3232ecpwr-tssop-16-tid-41461747.pdf?src-supplier=Conrad; ComponentLink2Description: https://datasheet.ciiva.com/41461/001187063-da-01-en-ic-multich-rs2-trs3232ecpwr-tssop-16-tid-41461747.pdf?src-supplier=Conrad; ComponentLink3URL: https://datasheet.ciiva.com/1702/trs3232e-1702920.pdf?src-supplier=Digi-Key; ComponentLink3Description: https://datasheet.ciiva.com/1702/trs3232e-1702920.pdf?src-supplier=Digi-Key; ComponentLink4URL: https://datasheet.ciiva.com/1702/trs3232e-1702921.pdf?src-supplier=Digi-Key; ComponentLink4Description: https://datasheet.ciiva.com/1702/trs3232e-1702921.pdf?src-supplier=Digi-Key; ComponentLink5URL: https://datasheet.ciiva.com/1702/trs3232e-1702875.pdf?src-supplier=Digi-Key; ComponentLink5Description: https://datasheet.ciiva.com/1702/trs3232e-1702875.pdf?src-supplier=Digi-Key; ComponentLink6URL: https://datasheet.ciiva.com/41677/1838938-41677467.pdf?src-supplier=Newark; ComponentLink6Description: https://datasheet.ciiva.com/41677/1838938-41677467.pdf?src-supplier=Newark; ComponentLink7URL: https://datasheet.ciiva.com/46436/1838938-46436111.pdf?src-supplier=Element14; ComponentLink7Description: https://datasheet.ciiva.com/46436/1838938-46436111.pdf?src-supplier=Element14; Supplier Part Number 1: 296-22596-1-ND; .SCHCHK: USED
footprint TSSOP16
pins: 1 C1+, 2 V+, 3 C1-, 4 C2+, 5 C2-, 6 V-, 7 DOUT2 (out), 8 RIN2 (in), 9 ROUT2 (out), 10 DIN2 (in), 11 DIN1 (in), 12 ROUT1 (out), 13 RIN1 (in), 14 DOUT1 (out), 15 GND (power), 16 VCC (power)

## IC-TSH122ICT
designator U?, comment TSH122ICT  Case/Package: SC-70
IC VIDEO BUFFER/FILTER ULP SC70; Manufacturer: STMicroelectronics; Operating Supply Voltage: 3V; Number of Circuits: 1; -3db Bandwidth: 9.5MHz; Min Supply Voltage: 2.25V; Max Supply Voltage: 5V; Nominal Supply Current: 2mA; Output Current per Channel: 75mA; Gain: 6dB; Supply Type: Single; Washability: OK; .Creator: M.OZKAN; .PCBCHK: USED; Supplier 1: Mouser; Manufacturer Part Number: TSH122ICT; Stock 1: 7711; Pricing 1: 1=0,76000, 10=0,63100, 100=0,40700, 1000=0,32600, 3000=0,27500, 9000=0,26500 (USD); RoHS: Yes; Mount: Surface Mount; Number of Pins: 6; Min Operating Temperature: -40°C; Max Operating Temperature: 85°C; Packaging: Tape and Reel; Package Quantity: 3000; Number of Channels: 1; Operating Supply Current: 2mA; Radiation Hardening: No; Lead Free: Lead Free; ComponentLink1URL: https://datasheet.ciiva.com/25666/cd00205551-25666485.pdf?src-supplier=Future+Electronics; ComponentLink1Description: https://datasheet.ciiva.com/25666/cd00205551-25666485.pdf?src-supplier=Future+Electronics; ComponentLink2URL: https://datasheet.ciiva.com/4766/cd00205551-85149-4766744.pdf?src-supplier=Mouser; ComponentLink2Description: https://datasheet.ciiva.com/4766/cd00205551-85149-4766744.pdf?src-supplier=Mouser; ComponentLink3URL: https://datasheet.ciiva.com/1823/cd00205551-1823937.pdf?src-supplier=Digi-Key; ComponentLink3Description: https://datasheet.ciiva.com/1823/cd00205551-1823937.pdf?src-supplier=Digi-Key; ComponentLink4URL: https://datasheet.ciiva.com/1823/cd00205551-1823938.pdf?src-supplier=Digi-Key; ComponentLink4Description: https://datasheet.ciiva.com/1823/cd00205551-1823938.pdf?src-supplier=Digi-Key; ComponentLink5URL: https://datasheet.ciiva.com/1823/cd00205551-1823939.pdf?src-supplier=Digi-Key; ComponentLink5Description: https://datasheet.ciiva.com/1823/cd00205551-1823939.pdf?src-supplier=Digi-Key; ComponentLink6URL: https://datasheet.ciiva.com/25898/cd00205551-25898230.pdf?src-supplier=Avnet+Europe; ComponentLink6Description: https://datasheet.ciiva.com/25898/cd00205551-25898230.pdf?src-supplier=Avnet+Europe; Supplier Part Number 1: 511-TSH122ICT; .SCHCHK: USED
footprint SC70-6 (SOT23, 6-Leads, Body 2,90x2,80mm, Pitch 0,95mm, IPC Medium Density)
pins: 1 IN (in), 2 GND (power), 3 SAG, 4 OUT (out), 5 EN (in), 6 VCC (power)
text: LPF; 2R; R

## IC-UC2843AQD8RQ1
designator U?, comment UC2843A
IC REG CTRLR MULT TOPOLOGY 8SOIC; Manufacturer: Texas Instruments; Manufacturer Part Number: UC2843AQD8RQ1; Number of Outputs: 1; Rise Time: 50ns; Max Supply Voltage: 30V; Output Current: 1A; Switching Frequency: 40kHz; Max Frequency: 500kHz; Duty Cycle: 100%; Output Voltage: 13.5V; Topology: Buck-Boost,Flyback; Washability: OK; .Creator: M.OZKAN; .PCBCHK: USED; Supplier 1: Digi-Key; Stock 1: 5819; Pricing 1: 1=1.26000, 10=1.12400, 25=1.06720, 100=0.81940, 250=0.72408, 500=0.68598, 1000=0.53354 (USD); RoHS: Yes; Case/Package: D; Number of Pins: 8; Weight: 0.002667oz; Min Operating Temperature: -40°C; Max Operating Temperature: 125°C; Packaging: Tape and Reel; Package Quantity: 1; Max Duty Cycle: 100%; Fall Time: 50ns; Radiation Hardening: No; Lead Free: Lead Free; ComponentLink1URL: https://datasheet.ciiva.com/2017/uc2843a-q1-2017072.pdf?src-supplier=Digi-Key; ComponentLink1Description: https://datasheet.ciiva.com/2017/uc2843a-q1-2017072.pdf?src-supplier=Digi-Key; ComponentLink2URL: https://datasheet.ciiva.com/26891/uc2843aqd8rq1-26891246.pdf?src-supplier=IIIC; ComponentLink2Description: https://datasheet.ciiva.com/26891/uc2843aqd8rq1-26891246.pdf?src-supplier=IIIC; ComponentLink3URL: https://datasheet.ciiva.com/14265/uc2843a-q1-14265000.pdf?src-supplier=Avnet; ComponentLink3Description: https://datasheet.ciiva.com/14265/uc2843a-q1-14265000.pdf?src-supplier=Avnet; Supplier Part Number 1: 296-24809-1-ND; .SCHCHK: USED
footprint D0008A_N (SOIC, 8-Leads, Body 5x4mm, Pitch 1.27mm, IPC Medium Density)
pins: 1 COMP (in), 2 FB (in), 3 ISNS (in), 4 RT/CT (in), 5 GND (power), 6 DRVOUT (out), 7 VCC (power), 8 VREF (power)

## IC-ULN2004D1013TR
designator U?, comment ULN2004
STMICROELECTRONICS - ULN2004D1013TR - TRANSISTOR ARRAY, 7 NPN, 16SOIC; Collector Emitter Voltage (VCEO): 50V; Number of Elements: 7; Max Output Current: 500mA; Collector Emitter Saturation Voltage: 1.1V; Washability: OK; .Creator: M.OZKAN; .PCBCHK: USED; Supplier 1: Digi-Key; Manufacturer: STMicroelectronics; Manufacturer Part Number: ULN2004D1013TR; Stock 1: 39105; Pricing 1: 1=0,51000, 10=0,43300, 100=0,32360, 500=0,25426, 1000=0,19647 (USD); RoHS: Yes; Mount: Surface Mount; Case/Package: SO; Number of Pins: 16; Weight: 0.007079oz; Min Operating Temperature: -20°C; Max Operating Temperature: 85°C; Package Quantity: 1; Packaging: Tape and Reel; Number of Channels: 7; Output Current: 500mA; Output Voltage: 50V; Polarity: NPN; Max Collector Current: 500mA; Collector Emitter Breakdown Voltage: 50V; Max Output Voltage: 50V; Voltage Rating (DC): 50V; Current Rating: 500mA; Length: 10mm; Height: 1.65mm; Width: 4mm; Radiation Hardening: No; REACH SVHC: No SVHC; Lead Free: Lead Free; ComponentLink1URL: https://datasheet.ciiva.com/1700/cd00001244-1700784.pdf?src-supplier=Digi-Key; ComponentLink1Description: https://datasheet.ciiva.com/1700/cd00001244-1700784.pdf?src-supplier=Digi-Key; ComponentLink2URL: https://datasheet.ciiva.com/1700/cd00001244-1700786.pdf?src-supplier=Digi-Key; ComponentLink2Description: https://datasheet.ciiva.com/1700/cd00001244-1700786.pdf?src-supplier=Digi-Key; ComponentLink3URL: https://datasheet.ciiva.com/4459/cd00001244-4459213.pdf?src-supplier=Mouser; ComponentLink3Description: https://datasheet.ciiva.com/4459/cd00001244-4459213.pdf?src-supplier=Mouser; ComponentLink4URL: https://datasheet.ciiva.com/16381/cd00001244-16381727.pdf?src-supplier=Future+Electronics; ComponentLink4Description: https://datasheet.ciiva.com/16381/cd00001244-16381727.pdf?src-supplier=Future+Electronics; ComponentLink5URL: https://datasheet.ciiva.com/1700/cd00001244-1700785.pdf?src-supplier=Digi-Key; ComponentLink5Description: https://datasheet.ciiva.com/1700/cd00001244-1700785.pdf?src-supplier=Digi-Key; ComponentLink6URL: https://datasheet.ciiva.com/22696/1690348-22696619.pdf?src-supplier=Element14; ComponentLink6Description: https://datasheet.ciiva.com/22696/1690348-22696619.pdf?src-supplier=Element14; ComponentLink7URL: https://datasheet.ciiva.com/1193/1690348-1193469.pdf?src-supplier=Element14; ComponentLink7Description: https://datasheet.ciiva.com/1193/1690348-1193469.pdf?src-supplier=Element14; Supplier Part Number 1: 497-2347-1-ND; .SCHCHK: USED
footprint SOIC16
pins: 1, 2, 3, 4, 5, 6, 7, 8 GND, 9 COM, 10, 11, 12, 13, 14, 15, 16

## IC-ULN2803ADWR
designator U?, comment ULN2803ADWR